# Altium footprint library LION.PcbLib: 90 footprints (part 6 of 13) (continued)
## FCBGA-576P [mil] "FCBGA-576P" (continued)
  lines w15: -472.44,-472.44 -452.76,-452.76 ; -472.44,-275.59 -452.76,-255.91 ; -472.44,-236.22 -452.76,-216.54 ; -472.44,-118.11 -452.76,-98.43 ; -472.44,39.37 -452.76,19.69 ; -472.44,157.48 -452.76,137.8 ; -472.44,275.59 -452.76,255.91 ; -472.44,314.96 -452.76,295.28 ; -472.44,472.44 -452.76,452.76 ; -433.07,-275.59 -413.39,-255.91 ; -433.07,-236.22 -413.39,-216.54 ; -433.07,-118.11 -413.39,-98.43 ; -433.07,39.37 -413.39,19.69 ; -433.07,157.48 -413.39,137.8 ; -433.07,275.59 -413.39,255.91 ; -433.07,314.96 -413.39,295.28 ; -433.07,354.33 -413.39,334.65 ; -393.7,-393.7 -374.02,-374.02 ; -393.7,-354.33 -374.02,-334.65 ; -393.7,-314.96 -374.02,-295.28 ; -393.7,-275.59 -374.02,-255.91 ; -393.7,-236.22 -374.02,-216.54 ; -393.7,-196.85 -374.02,-177.17 ; -393.7,-157.48 -374.02,-137.8 ; -393.7,-118.11 -374.02,-98.43 ; -393.7,-78.74 -374.02,-59.06 ; -393.7,-39.37 -374.02,-19.69 ; -393.7,39.37 -374.02,19.69 ; -393.7,78.74 -374.02,59.06 ; -393.7,118.11 -374.02,98.43 ; -393.7,157.48 -374.02,137.8 ; -393.7,196.85 -374.02,177.17 ; -393.7,236.22 -374.02,216.54 ; -393.7,275.59 -374.02,255.91 ; -393.7,314.96 -374.02,295.28 ; -393.7,354.33 -374.02,334.65 ; -393.7,393.7 -374.02,374.02 ; -393.7,433.07 -374.02,413.39 ; -393.7,472.44 -374.02,452.76 ; -354.33,-393.7 -334.65,-374.02 ; -354.33,-354.33 -334.65,-334.65 ; -354.33,-314.96 -334.65,-295.28 ; -354.33,-275.59 -334.65,-255.91 ; -354.33,-236.22 -334.65,-216.54 ; -354.33,-118.11 -334.65,-98.43 ; -354.33,39.37 -334.65,19.69 ; -354.33,157.48 -334.65,137.8 ; -354.33,275.59 -334.65,255.91 ; -354.33,314.96 -334.65,295.28 ; -354.33,354.33 -334.65,334.65 ; -354.33,393.7 -334.65,374.02 ; -354.33,433.07 -334.65,413.39 ; -354.33,472.44 -334.65,452.76 ; -314.96,-433.07 -295.28,-413.39 ; -314.96,-393.7 -295.28,-374.02 ; -314.96,-354.33 -295.28,-334.65 ; -314.96,-314.96 -295.28,-295.28 ; -314.96,-275.59 -295.28,-255.91 ; -314.96,-236.22 -295.28,-216.54 ; -314.96,-118.11 -295.28,-98.43 ; -314.96,39.37 -295.28,19.69 ; -314.96,157.48 -295.28,137.8 ; -314.96,275.59 -295.28,255.91 ; -314.96,314.96 -295.28,295.28 ; -314.96,354.33 -295.28,334.65 ; -314.96,393.7 -295.28,374.02 ; -314.96,433.07 -295.28,413.39 ; -314.96,472.44 -295.28,452.76 ; -275.59,-472.44 -255.91,-452.76 ; -275.59,-433.07 -255.91,-413.39 ; -275.59,-393.7 -255.91,-374.02 ; -275.59,-354.33 -255.91,-334.65 ; -275.59,-314.96 -255.91,-295.28 ; -275.59,-275.59 -255.91,-255.91 ; -275.59,-236.22 -255.91,-216.54 ; -275.59,-196.85 -255.91,-177.17 ; -275.59,-157.48 -255.91,-137.8 ; -275.59,-118.11 -255.91,-98.43 ; -275.59,-78.74 -255.91,-59.06 ; -275.59,-39.37 -255.91,-19.69 ; -275.59,39.37 -255.91,19.69 ; -275.59,78.74 -255.91,59.06 ; -275.59,118.11 -255.91,98.43 ; -275.59,157.48 -255.91,137.8 ; -275.59,196.85 -255.91,177.17 ; -275.59,236.22 -255.91,216.54 ; -275.59,275.59 -255.91,255.91 ; -275.59,314.96 -255.91,295.28 ; -275.59,354.33 -255.91,334.65 ; -275.59,393.7 -255.91,374.02 ; -275.59,433.07 -255.91,413.39 ; -275.59,472.44 -255.91,452.76 ; -236.22,-393.7 -216.54,-374.02 ; -236.22,-275.59 -216.54,-255.91 ; -236.22,-236.22 -216.54,-216.54 ; -236.22,-196.85 -216.54,-177.17 ; -236.22,-157.48 -216.54,-137.8 ; -236.22,-118.11 -216.54,-98.43 ; -236.22,-78.74 -216.54,-59.06 ; -236.22,-39.37 -216.54,-19.69 ; -236.22,39.37 -216.54,19.69 ; -236.22,78.74 -216.54,59.06 ; -236.22,118.11 -216.54,98.43 ; -236.22,157.48 -216.54,137.8 ; -236.22,196.85 -216.54,177.17 ; -236.22,236.22 -216.54,216.54 ; -236.22,275.59 -216.54,255.91 ; -236.22,314.96 -216.54,295.28 ; -236.22,354.33 -216.54,334.65 ; -236.22,393.7 -216.54,374.02 ; -236.22,433.07 -216.54,413.39 ; -236.22,472.44 -216.54,452.76 ; -196.85,-393.7 -177.17,-374.02 ; -196.85,-275.59 -177.17,-255.91 ; -196.85,-236.22 -177.17,-216.54 ; -196.85,-196.85 -177.17,-177.17 ; -196.85,-157.48 -177.17,-137.8 ; -196.85,-118.11 -177.17,-98.43 ; -196.85,-78.74 -177.17,-59.06 ; -196.85,-39.37 -177.17,-19.69 ; -196.85,39.37 -177.17,19.69 ; -196.85,78.74 -177.17,59.06 ; -196.85,118.11 -177.17,98.43 ; -196.85,157.48 -177.17,137.8 ; -196.85,196.85 -177.17,177.17 ; -196.85,236.22 -177.17,216.54 ; -196.85,275.59 -177.17,255.91 ; -196.85,393.7 -177.17,374.02 ; -157.48,-472.44 -137.8,-452.76 ; -157.48,-433.07 -137.8,-413.39 ; -157.48,-393.7 -137.8,-374.02 ; -157.48,-354.33 -137.8,-334.65 ; -157.48,-314.96 -137.8,-295.28 ; -157.48,-275.59 -137.8,-255.91 ; -157.48,-236.22 -137.8,-216.54 ; -157.48,-196.85 -137.8,-177.17 ; -157.48,-157.48 -137.8,-137.8 ; -157.48,-118.11 -137.8,-98.43 ; -157.48,-78.74 -137.8,-59.06 ; -157.48,-39.37 -137.8,-19.69 ; -157.48,39.37 -137.8,19.69 ; -157.48,78.74 -137.8,59.06 ; -157.48,118.11 -137.8,98.43 ; -157.48,157.48 -137.8,137.8 ; -157.48,196.85 -137.8,177.17 ; -157.48,236.22 -137.8,216.54 ; -157.48,275.59 -137.8,255.91 ; -157.48,393.7 -137.8,374.02 ; -118.11,-393.7 -98.43,-374.02 ; -118.11,-275.59 -98.43,-255.91 ; -118.11,-236.22 -98.43,-216.54 ; -118.11,-196.85 -98.43,-177.17 ; -118.11,-157.48 -98.43,-137.8 ; -118.11,-118.11 -98.43,-98.43 ; -118.11,-78.74 -98.43,-59.06 ; -118.11,-39.37 -98.43,-19.69 ; -118.11,39.37 -98.43,19.69 ; -118.11,78.74 -98.43,59.06 ; -118.11,118.11 -98.43,98.43 ; -118.11,157.48 -98.43,137.8 ; -118.11,196.85 -98.43,177.17 ; -118.11,236.22 -98.43,216.54 ; -118.11,275.59 -98.43,255.91 ; -118.11,314.96 -98.43,295.28 ; -118.11,354.33 -98.43,334.65 ; -118.11,393.7 -98.43,374.02 ; -118.11,433.07 -98.43,413.39 ; -118.11,472.44 -98.43,452.76 ; -78.74,-393.7 -59.06,-374.02 ; -78.74,-275.59 -59.06,-255.91 ; -78.74,-236.22 -59.06,-216.54 ; -78.74,-196.85 -59.06,-177.17 ; -78.74,-157.48 -59.06,-137.8 ; -78.74,-118.11 -59.06,-98.43 ; -78.74,-78.74 -59.06,-59.06 ; -78.74,-39.37 -59.06,-19.69 ; -78.74,39.37 -59.06,19.69 ; -78.74,78.74 -59.06,59.06 ; -78.74,118.11 -59.06,98.43 ; -78.74,157.48 -59.06,137.8 ; -78.74,196.85 -59.06,177.17 ; -78.74,236.22 -59.06,216.54 ; -78.74,275.59 -59.06,255.91 ; -78.74,393.7 -59.06,374.02 ; -39.37,-472.44 -19.69,-452.76 ; -39.37,-433.07 -19.69,-413.39 ; -39.37,-393.7 -19.69,-374.02 ; -39.37,-354.33 -19.69,-334.65 ; -39.37,-314.96 -19.69,-295.28 ; -39.37,-275.59 -19.69,-255.91 ; -39.37,-236.22 -19.69,-216.54 ; -39.37,-196.85 -19.69,-177.17 ; -39.37,-157.48 -19.69,-137.8 ; -39.37,-118.11 -19.69,-98.43 ; -39.37,-78.74 -19.69,-59.06 ; -39.37,-39.37 -19.69,-19.69 ; -39.37,39.37 -19.69,19.69 ; -39.37,78.74 -19.69,59.06 ; -39.37,118.11 -19.69,98.43 ; -39.37,157.48 -19.69,137.8 ; -39.37,196.85 -19.69,177.17 ; -39.37,236.22 -19.69,216.54 ; -39.37,275.59 -19.69,255.91 ; -39.37,393.7 -19.69,374.02 ; 19.69,-374.02 39.37,-393.7 ; 19.69,-255.91 39.37,-275.59 ; 19.69,-216.54 39.37,-236.22 ; 19.69,-177.17 39.37,-196.85 ; 19.69,-137.8 39.37,-157.48 ; 19.69,-98.43 39.37,-118.11 ; 19.69,-59.06 39.37,-78.74 ; 19.69,-19.69 39.37,-39.37 ; 19.69,19.69 39.37,39.37 ; 19.69,59.06 39.37,78.74 ; 19.69,98.43 39.37,118.11 ; 19.69,137.8 39.37,157.48 ; 19.69,177.17 39.37,196.85 ; 19.69,216.54 39.37,236.22 ; 19.69,255.91 39.37,275.59 ; 19.69,295.28 39.37,314.96 ; 19.69,334.65 39.37,354.33 ; 19.69,374.02 39.37,393.7 ; 19.69,413.39 39.37,433.07 ; 19.69,452.76 39.37,472.44 ; 59.06,-374.02 78.74,-393.7 ; 59.06,-255.91 78.74,-275.59 ; 59.06,-216.54 78.74,-236.22 ; 59.06,-177.17 78.74,-196.85 ; 59.06,-137.8 78.74,-157.48 ; 59.06,-98.43 78.74,-118.11 ; 59.06,-59.06 78.74,-78.74 ; 59.06,-19.69 78.74,-39.37 ; 59.06,19.69 78.74,39.37 ; 59.06,59.06 78.74,78.74 ; 59.06,98.43 78.74,118.11 ; 59.06,137.8 78.74,157.48 ; 59.06,177.17 78.74,196.85 ; 59.06,216.54 78.74,236.22 ; 59.06,255.91 78.74,275.59 ; 59.06,374.02 78.74,393.7 ; 98.43,-452.76 118.11,-472.44 ; 98.43,-413.39 118.11,-433.07 ; 98.43,-374.02 118.11,-393.7 ; 98.43,-334.65 118.11,-354.33 ; 98.43,-295.28 118.11,-314.96 ; 98.43,-255.91 118.11,-275.59 ; 98.43,-216.54 118.11,-236.22 ; 98.43,-177.17 118.11,-196.85 ; 98.43,-137.8 118.11,-157.48 ; 98.43,-98.43 118.11,-118.11 ; 98.43,-59.06 118.11,-78.74 ; 98.43,-19.69 118.11,-39.37 ; 98.43,19.69 118.11,39.37 ; 98.43,59.06 118.11,78.74 ; 98.43,98.43 118.11,118.11 ; 98.43,137.8 118.11,157.48 ; 98.43,177.17 118.11,196.85 ; 98.43,216.54 118.11,236.22 ; 98.43,255.91 118.11,275.59 ; 98.43,374.02 118.11,393.7 ; 137.8,-374.02 157.48,-393.7 ; 137.8,-255.91 157.48,-275.59 ; 137.8,-216.54 157.48,-236.22 ; 137.8,-177.17 157.48,-196.85 ; 137.8,-137.8 157.48,-157.48 ; 137.8,-98.43 157.48,-118.11 ; 137.8,-59.06 157.48,-78.74 ; 137.8,-19.69 157.48,-39.37 ; 137.8,19.69 157.48,39.37 ; 137.8,59.06 157.48,78.74 ; 137.8,98.43 157.48,118.11 ; 137.8,137.8 157.48,157.48 ; 137.8,177.17 157.48,196.85 ; 137.8,216.54 157.48,236.22 ; 137.8,255.91 157.48,275.59 ; 137.8,295.28 157.48,314.96 ; 137.8,334.65 157.48,354.33 ; 137.8,374.02 157.48,393.7 ; 137.8,413.39 157.48,433.07 ; 137.8,452.76 157.48,472.44 ; 177.17,-374.02 196.85,-393.7 ; 177.17,-255.91 196.85,-275.59 ; 177.17,-216.54 196.85,-236.22 ; 177.17,-177.17 196.85,-196.85 ; 177.17,-137.8 196.85,-157.48 ; 177.17,-98.43 196.85,-118.11 ; 177.17,-59.06 196.85,-78.74 ; 177.17,-19.69 196.85,-39.37 ; 177.17,19.69 196.85,39.37 ; 177.17,59.06 196.85,78.74 ; 177.17,98.43 196.85,118.11 ; 177.17,137.8 196.85,157.48 ; 177.17,177.17 196.85,196.85 ; 177.17,216.54 196.85,236.22 ; 177.17,255.91 196.85,275.59 ; 177.17,374.02 196.85,393.7 ; 216.54,-452.76 236.22,-472.44 ; 216.54,-413.39 236.22,-433.07 ; 216.54,-374.02 236.22,-393.7 ; 216.54,-334.65 236.22,-354.33 ; 216.54,-295.28 236.22,-314.96 ; 216.54,-255.91 236.22,-275.59 ; 216.54,-216.54 236.22,-236.22 ; 216.54,-177.17 236.22,-196.85 ; 216.54,-137.8 236.22,-157.48 ; 216.54,-98.43 236.22,-118.11 ; 216.54,-59.06 236.22,-78.74 ; 216.54,-19.69 236.22,-39.37 ; 216.54,19.69 236.22,39.37 ; 216.54,59.06 236.22,78.74 ; 216.54,98.43 236.22,118.11 ; 216.54,137.8 236.22,157.48 ; 216.54,177.17 236.22,196.85 ; 216.54,216.54 236.22,236.22 ; 216.54,255.91 236.22,275.59 ; 216.54,374.02 236.22,393.7 ; 255.91,-452.76 275.59,-472.44 ; 255.91,-413.39 275.59,-433.07 ; 255.91,-374.02 275.59,-393.7 ; 255.91,-334.65 275.59,-354.33 ; 255.91,-295.28 275.59,-314.96 ; 255.91,-255.91 275.59,-275.59 ; 255.91,-216.54 275.59,-236.22 ; 255.91,-177.17 275.59,-196.85 ; 255.91,-137.8 275.59,-157.48 ; 255.91,-98.43 275.59,-118.11 ; 255.91,-59.06 275.59,-78.74 ; 255.91,-19.69 275.59,-39.37 ; 255.91,19.69 275.59,39.37 ; 255.91,59.06 275.59,78.74 ; 255.91,98.43 275.59,118.11 ; 255.91,137.8 275.59,157.48 ; 255.91,177.17 275.59,196.85 ; 255.91,216.54 275.59,236.22 ; 255.91,255.91 275.59,275.59 ; 255.91,295.28 275.59,314.96 ; 255.91,334.65 275.59,354.33 ; 255.91,374.02 275.59,393.7 ; 255.91,413.39 275.59,433.07 ; 255.91,452.76 275.59,472.44 ; 295.28,-452.76 314.96,-472.44 ; 295.28,-413.39 314.96,-433.07 ; 295.28,-374.02 314.96,-393.7 ; 295.28,-334.65 314.96,-354.33 ; 295.28,-295.28 314.96,-314.96 ; 295.28,-255.91 314.96,-275.59 ; 295.28,-137.8 314.96,-157.48 ; 295.28,-19.69 314.96,-39.37 ; 295.28,98.43 314.96,118.11 ; 295.28,216.54 314.96,236.22 ; 295.28,255.91 314.96,275.59 ; 295.28,295.28 314.96,314.96 ; 295.28,334.65 314.96,354.33 ; 295.28,374.02 314.96,393.7 ; 334.65,-452.76 354.33,-472.44 ; 334.65,-413.39 354.33,-433.07 ; 334.65,-295.28 354.33,-314.96 ; 334.65,-255.91 354.33,-275.59 ; 334.65,-137.8 354.33,-157.48 ; 334.65,-19.69 354.33,-39.37 ; 334.65,98.43 354.33,118.11 ; 334.65,216.54 354.33,236.22 ; 334.65,255.91 354.33,275.59 ; 334.65,295.28 354.33,314.96 ; 334.65,334.65 354.33,354.33 ; 334.65,374.02 354.33,393.7 ; 374.02,-413.39 393.7,-433.07 ; 374.02,-295.28 393.7,-314.96 ; 374.02,-255.91 393.7,-275.59 ; 374.02,-216.54 393.7,-236.22 ; 374.02,-177.17 393.7,-196.85 ; 374.02,-137.8 393.7,-157.48 ; 374.02,-98.43 393.7,-118.11 ; 374.02,-59.06 393.7,-78.74 ; 374.02,-19.69 393.7,-39.37 ; 374.02,19.69 393.7,39.37 ; 374.02,59.06 393.7,78.74 ; 374.02,98.43 393.7,118.11 ; 374.02,137.8 393.7,157.48 ; 374.02,177.17 393.7,196.85 ; 374.02,216.54 393.7,236.22 ; 374.02,255.91 393.7,275.59 ; 374.02,295.28 393.7,314.96 ; 374.02,334.65 393.7,354.33 ; 374.02,374.02 393.7,393.7 ; 413.39,-413.39 433.07,-433.07 ; 413.39,-374.02 433.07,-393.7 ; 413.39,-334.65 433.07,-354.33 ; 413.39,-295.28 433.07,-314.96 ; 413.39,-255.91 433.07,-275.59 ; 413.39,-137.8 433.07,-157.48 ; 413.39,-19.69 433.07,-39.37 ; 413.39,98.43 433.07,118.11 ; 413.39,216.54 433.07,236.22 ; 413.39,255.91 433.07,275.59 ; 413.39,295.28 433.07,314.96 ; 452.76,-452.76 472.44,-472.44 ; 452.76,-374.02 472.44,-393.7 ; 452.76,-255.91 472.44,-275.59 ; 452.76,-137.8 472.44,-157.48 ; 452.76,-19.69 472.44,-39.37 ; 452.76,98.43 472.44,118.11 ; 452.76,216.54 472.44,236.22 ; 452.76,255.91 472.44,275.59 ; 452.76,452.76 472.44,472.44
Bottom Layer:
  lines w15: -635.92,-427.69 -621.51,-413.28 -590.72,-413.28
Top Overlay:
  pour cut-out: -492.13,450.39 -492.13,451.18 -451.18,492.13 -492.13,492.13 -492.52,491.73 -492.52,450.39
  lines w1: -492.13,-492.13 492.13,-492.13 492.13,492.13 -492.13,492.13 -492.13,-492.13
Mechanical 5:
  lines w1: -492.13,-492.13 492.13,-492.13 492.13,492.13 -492.13,492.13 -492.13,-492.13
  text "U61" at -13.43,509.81 h25
Mechanical 14:
  text "H5" at -311.28,177.17 h20
  text "H4" at -350.65,177.17 h20
  text "G2" at -429.39,216.54 h20
  text "K1" at -468.76,98.43 h20
  text "K2" at -429.39,98.43 h20
  text "G1" at -468.76,216.54 h20
  text "L1" at -468.76,59.06 h20
  text "L2" at -429.39,59.06 h20
  text "H1" at -468.76,177.17 h20
  text "H2" at -429.39,177.17 h20
  text "AD5" at -319.28,-452.76 h20
  text "AB22" at 342.02,-374.02 h20
  text "AA22" at 342.02,-334.65 h20
  text "AC4" at -358.65,-413.39 h20
  text "D24" at 428.76,334.65 h20
  text "B24" at 428.76,413.39 h20
  text "C23" at 389.39,374.02 h20
  text "C1" at -468.76,374.02 h20
  text "AD4" at -358.65,-452.76 h20
  text "D23" at 389.39,334.65 h20
  text "Y8" at -193.17,-295.28 h20
  text "AA11" at -91.06,-334.65 h20
  text "AA7" at -240.54,-334.65 h20
  text "AA10" at -130.43,-334.65 h20
  text "Y11" at -83.06,-295.28 h20
  text "AA8" at -201.17,-334.65 h20
  text "Y10" at -122.43,-295.28 h20
  text "Y7" at -232.54,-295.28 h20
  text "U23" at 389.39,-177.17 h20
  text "U24" at 428.76,-177.17 h20
  text "R23" at 389.39,-98.43 h20
  text "R24" at 428.76,-98.43 h20
  text "P24" at 428.76,-59.06 h20
  text "P23" at 389.39,-59.06 h20
  text "V24" at 428.76,-216.54 h20
  text "V23" at 389.39,-216.54 h20
  text "A8" at -193.17,452.76 h20
  text "B8" at -193.17,413.39 h20
  text "A9" at -153.8,452.76 h20
  text "B9" at -153.8,413.39 h20
  text "A11" at -83.06,452.76 h20
  text "B11" at -83.06,413.39 h20
  text "A12" at -43.69,452.76 h20
  text "B12" at -43.69,413.39 h20
  text "H24" at 428.76,177.17 h20
  text "H23" at 389.39,177.17 h20
  text "J24" at 428.76,137.8 h20
  text "J23" at 389.39,137.8 h20
  text "L24" at 428.76,59.06 h20
  text "L23" at 389.39,59.06 h20
  text "M24" at 428.76,19.69 h20
  text "M23" at 389.39,19.69 h20
  text "A14" at 35.06,452.76 h20
  text "B14" at 35.06,413.39 h20
  text "A15" at 74.43,452.76 h20
  text "B15" at 74.43,413.39 h20
  text "A17" at 153.17,452.76 h20
  text "B17" at 153.17,413.39 h20
  text "A18" at 192.54,452.76 h20
  text "B18" at 192.54,413.39 h20
  text "Y13" at -4.31,-295.28 h20
  text "L5" at -311.28,59.06 h20
  text "E14" at 35.06,295.28 h20
  text "P4" at -350.65,-59.06 h20
  text "U5" at -311.28,-177.17 h20
  text "E12" at -43.69,295.28 h20
  text "L20" at 271.28,59.06 h20
  text "M21" at 310.65,19.69 h20
  text "D11" at -83.06,334.65 h20
  text "G4" at -350.65,216.54 h20
  text "AA13" at -12.31,-334.65 h20
  text "M20" at 271.28,19.69 h20
  text "R20" at 271.28,-98.43 h20
  text "H21" at 310.65,177.17 h20
  text "D9" at -153.8,334.65 h20
  text "P5" at -311.28,-59.06 h20
  text "P21" at 310.65,-59.06 h20
  text "D18" at 192.54,334.65 h20
  text "AB21" at 302.65,-374.02 h20
  text "D12" at -43.69,334.65 h20
  text "J21" at 310.65,137.8 h20
  text "AA1" at -476.76,-334.65 h20
  text "Y16" at 113.8,-295.28 h20
  text "D8" at -193.17,334.65 h20
  text "K5" at -311.28,98.43 h20
  text "N5" at -311.28,-19.69 h20
  text "L21" at 310.65,59.06 h20
  text "AA14" at 27.06,-334.65 h20
  text "AA21" at 302.65,-334.65 h20
  text "B20" at 271.28,413.39 h20
  text "E17" at 153.17,295.28 h20
  text "Y14" at 35.06,-295.28 h20
  text "Y17" at 153.17,-295.28 h20
  text "E9" at -153.8,295.28 h20
  text "E11" at -83.06,295.28 h20
  text "T5" at -311.28,-137.8 h20
  text "Y24" at 428.76,-295.28 h20
  text "B2" at -429.39,413.39 h20
  text "P20" at 271.28,-59.06 h20
  text "U20" at 271.28,-177.17 h20
  text "AA2" at -437.39,-334.65 h20
  text "AB2" at -437.39,-374.02 h20
  text "E15" at 74.43,295.28 h20
  text "C24" at 428.76,374.02 h20
  text "AC2" at -437.39,-413.39 h20
  text "K4" at -350.65,98.43 h20
  text "T4" at -350.65,-137.8 h20
  text "N4" at -350.65,-19.69 h20
  text "AB1" at -476.76,-374.02 h20
  text "AD2" at -437.39,-452.76 h20
  text "D15" at 74.43,334.65 h20
  text "AD3" at -398.02,-452.76 h20
  text "U4" at -350.65,-177.17 h20
  text "V21" at 310.65,-216.54 h20
  text "H20" at 271.28,177.17 h20
  text "L4" at -350.65,59.06 h20
  text "A21" at 310.65,452.76 h20
  text "R21" at 310.65,-98.43 h20
  text "AA24" at 420.76,-334.65 h20
  text "AC1" at -476.76,-413.39 h20
  text "AC3" at -398.02,-413.39 h20
  text "E8" at -193.17,295.28 h20
  text "G5" at -311.28,216.54 h20
  text "AA16" at 105.8,-334.65 h20
  text "B1" at -468.76,413.39 h20
  text "J20" at 271.28,137.8 h20
  text "D14" at 35.06,334.65 h20
  text "E18" at 192.54,295.28 h20
  text "A2" at -429.39,452.76 h20
  text "D1" at -468.76,334.65 h20
  text "AA17" at 145.17,-334.65 h20
  text "C2" at -429.39,374.02 h20
  text "V20" at 271.28,-216.54 h20
  text "U21" at 310.65,-177.17 h20
  text "D17" at 153.17,334.65 h20
  text "AC6" at -279.91,-413.39 h20
  text "AD6" at -279.91,-452.76 h20
  text "AD9" at -161.8,-452.76 h20
  text "AC9" at -161.8,-413.39 h20
  text "AC12" at -51.69,-413.39 h20
  text "AD12" at -51.69,-452.76 h20
  text "AC15" at 66.43,-413.39 h20
  text "AD15" at 66.43,-452.76 h20
  text "AD18" at 184.54,-452.76 h20
  text "AC18" at 184.54,-413.39 h20
  text "V2" at -429.39,-216.54 h20
  text "R2" at -429.39,-98.43 h20
  text "R1" at -468.76,-98.43 h20
  text "V1" at -468.76,-216.54 h20
  text "W23" at 389.39,-255.91 h20
  text "W24" at 428.76,-255.91 h20
  text "T23" at 389.39,-137.8 h20
  text "T24" at 428.76,-137.8 h20
  text "J2" at -429.39,137.8 h20
  text "J1" at -468.76,137.8 h20
  text "M1" at -468.76,19.69 h20
  text "M2" at -429.39,19.69 h20
  text "G24" at 428.76,216.54 h20
  text "G23" at 389.39,216.54 h20
  text "K23" at 389.39,98.43 h20
  text "K24" at 428.76,98.43 h20
  text "F1" at -468.76,255.91 h20
  text "F2" at -429.39,255.91 h20
  text "A10" at -122.43,452.76 h20
  text "B10" at -122.43,413.39 h20
  text "A13" at -4.31,452.76 h20
  text "B13" at -4.31,413.39 h20
  text "B7" at -232.54,413.39 h20
  text "A7" at -232.54,452.76 h20
  text "A16" at 113.8,452.76 h20
  text "A19" at 231.91,452.76 h20
  text "B19" at 231.91,413.39 h20
  text "B16" at 113.8,413.39 h20
  text "N23" at 389.39,-19.69 h20
  text "N24" at 428.76,-19.69 h20
  text "W4" at -350.65,-255.91 h20
  text "W5" at -311.28,-255.91 h20
  text "Y9" at -153.8,-295.28 h20
  text "AA9" at -161.8,-334.65 h20
  text "W9" at -153.8,-255.91 h20
  text "AA15" at 66.43,-334.65 h20
  text "Y15" at 74.43,-295.28 h20
  text "W15" at 74.43,-255.91 h20
  text "T19" at 231.91,-137.8 h20
  text "Y19" at 231.91,-295.28 h20
  text "R5" at -311.28,-98.43 h20
  text "R4" at -350.65,-98.43 h20
  text "R6" at -271.91,-98.43 h20
  text "AA19" at 223.91,-334.65 h20
  text "AB23" at 381.39,-374.02 h20
  text "AA23" at 381.39,-334.65 h20
  text "E5" at -311.28,295.28 h20
  text "E6" at -271.91,295.28 h20
  text "F16" at 113.8,255.91 h20
  text "F10" at -122.43,255.91 h20
  text "E16" at 113.8,295.28 h20
  text "D16" at 113.8,334.65 h20
  text "E10" at -122.43,295.28 h20
  text "D10" at -122.43,334.65 h20
  text "J4" at -350.65,137.8 h20
  text "J5" at -311.28,137.8 h20
  text "J6" at -271.91,137.8 h20
  text "T20" at 271.28,-137.8 h20
  text "T21" at 310.65,-137.8 h20
  text "K19" at 231.91,98.43 h20
  text "K20" at 271.28,98.43 h20
  text "K21" at 310.65,98.43 h20
  text "F21" at 310.65,255.91 h20
  text "F20" at 271.28,255.91 h20
  text "W6" at -271.91,-255.91 h20
  text "Y6" at -271.91,-295.28 h20
  text "AA6" at -279.91,-334.65 h20
  text "V4" at -350.65,-216.54 h20
  text "V5" at -311.28,-216.54 h20
  text "Y18" at 192.54,-295.28 h20
  text "AA18" at 184.54,-334.65 h20
  text "Y22" at 350.02,-295.28 h20
  text "W20" at 271.28,-255.91 h20
  text "W21" at 310.65,-255.91 h20
  text "W19" at 231.91,-255.91 h20
  text "W12" at -43.69,-255.91 h20
  text "AA12" at -51.69,-334.65 h20
  text "Y12" at -43.69,-295.28 h20
  text "D7" at -232.54,334.65 h20
  text "E7" at -232.54,295.28 h20
  text "F6" at -271.91,255.91 h20
  text "F4" at -350.65,255.91 h20
  text "F5" at -311.28,255.91 h20
  text "E3" at -390.02,295.28 h20
  text "M6" at -271.91,19.69 h20
  text "M5" at -311.28,19.69 h20
  text "M4" at -350.65,19.69 h20
  text "E19" at 231.91,295.28 h20
  text "F19" at 231.91,255.91 h20
  text "D19" at 231.91,334.65 h20
  text "D13" at -4.31,334.65 h20
  text "E13" at -4.31,295.28 h20
  text "F13" at -4.31,255.91 h20
  text "N19" at 231.91,-19.69 h20
  text "N20" at 271.28,-19.69 h20
  text "N21" at 310.65,-19.69 h20
  text "G20" at 271.28,216.54 h20
  text "G21" at 310.65,216.54 h20
  text "V10" at -122.43,-216.54 h20
  text "V11" at -83.06,-216.54 h20
  text "T8" at -193.17,-137.8 h20
  text "T9" at -153.8,-137.8 h20
  text "U9" at -153.8,-177.17 h20
  text "V7" at -232.54,-216.54 h20
  text "U8" at -193.17,-177.17 h20
  text "P11" at -83.06,-59.06 h20
  text "R11" at -83.06,-98.43 h20
  text "P10" at -122.43,-59.06 h20
  text "R10" at -122.43,-98.43 h20
  text "L7" at -232.54,59.06 h20
  text "P7" at -232.54,-59.06 h20
  text "L10" at -122.43,59.06 h20
  text "K10" at -122.43,98.43 h20
  text "M9" at -153.8,19.69 h20
  text "M8" at -193.17,19.69 h20
  text "K11" at -83.06,98.43 h20
  text "L11" at -83.06,59.06 h20
  text "N8" at -193.17,-19.69 h20
  text "N9" at -153.8,-19.69 h20
  text "K7" at -232.54,98.43 h20
  text "J8" at -193.17,137.8 h20
  text "J9" at -153.8,137.8 h20
  text "J12" at -43.69,137.8 h20
  text "G11" at -83.06,216.54 h20
  text "H12" at -43.69,177.17 h20
  text "H8" at -193.17,177.17 h20
  text "G7" at -232.54,216.54 h20
  text "H9" at -153.8,177.17 h20
  text "V14" at 35.06,-216.54 h20
  text "U13" at -4.31,-177.17 h20
  text "T13" at -4.31,-137.8 h20
  text "T12" at -43.69,-137.8 h20
  text "U12" at -43.69,-177.17 h20
  text "P14" at 35.06,-59.06 h20
  text "R14" at 35.06,-98.43 h20
  text "V18" at 192.54,-216.54 h20
  text "T16" at 113.8,-137.8 h20
  text "T17" at 153.17,-137.8 h20
  text "U16" at 113.8,-177.17 h20
  text "U17" at 153.17,-177.17 h20
  text "R18" at 192.54,-98.43 h20
  text "P15" at 74.43,-59.06 h20
  text "R15" at 74.43,-98.43 h20
  text "L14" at 35.06,59.06 h20
  text "K14" at 35.06,98.43 h20
  text "M13" at -4.31,19.69 h20
  text "M12" at -43.69,19.69 h20
  text "N13" at -4.31,-19.69 h20
  text "N12" at -43.69,-19.69 h20
  text "J13" at -4.31,137.8 h20
  text "G14" at 35.06,216.54 h20
  text "H13" at -4.31,177.17 h20
  text "P18" at 192.54,-59.06 h20
  text "M16" at 113.8,19.69 h20
  text "M17" at 153.17,19.69 h20
  text "L18" at 192.54,59.06 h20
  text "K15" at 74.43,98.43 h20
  text "L15" at 74.43,59.06 h20
  text "N17" at 153.17,-19.69 h20
  text "N16" at 113.8,-19.69 h20
  text "J16" at 113.8,137.8 h20
  text "J17" at 153.17,137.8 h20
  text "H16" at 113.8,177.17 h20
  text "H17" at 153.17,177.17 h20
  text "G18" at 192.54,216.54 h20
  text "G15" at 74.43,216.54 h20
  text "AC14" at 27.06,-413.39 h20
  text "AD13" at -12.31,-452.76 h20
  text "AC17" at 145.17,-413.39 h20
  text "AD16" at 105.8,-452.76 h20
  text "AC13" at -12.31,-413.39 h20
  text "AD17" at 145.17,-452.76 h20
  text "AC16" at 105.8,-413.39 h20
  text "AD14" at 27.06,-452.76 h20
  text "AD10" at -130.43,-452.76 h20
  text "AC10" at -130.43,-413.39 h20
  text "AC7" at -240.54,-413.39 h20
  text "AD11" at -91.06,-452.76 h20
  text "AC11" at -91.06,-413.39 h20
  text "AC8" at -201.17,-413.39 h20
  text "AD8" at -201.17,-452.76 h20
  text "AD7" at -240.54,-452.76 h20
  text "AC24" at 420.76,-413.39 h20
  text "A20" at 271.28,452.76 h20
  text "A22" at 350.02,452.76 h20
  text "AD23" at 381.39,-452.76 h20
  text "A23" at 389.39,452.76 h20
  text "AD22" at 342.02,-452.76 h20
  text "B23" at 389.39,413.39 h20
  text "Y1" at -468.76,-295.28 h20
  text "Y2" at -429.39,-295.28 h20
  text "B22" at 350.02,413.39 h20
  text "B21" at 310.65,413.39 h20
  text "E24" at 428.76,295.28 h20
  text "U1" at -468.76,-177.17 h20
  text "T2" at -429.39,-137.8 h20
  text "P1" at -468.76,-59.06 h20
  text "U2" at -429.39,-177.17 h20
  text "N1" at -468.76,-19.69 h20
  text "T1" at -468.76,-137.8 h20
  text "P2" at -429.39,-59.06 h20
  text "N2" at -429.39,-19.69 h20
  text "AB3" at -398.02,-374.02 h20
  text "AB4" at -358.65,-374.02 h20
  text "AC5" at -319.28,-413.39 h20
  text "AA3" at -398.02,-334.65 h20
  text "AB20" at 263.28,-374.02 h20
  text "AD19" at 223.91,-452.76 h20
  text "AC20" at 263.28,-413.39 h20
  text "AD20" at 263.28,-452.76 h20
  text "AC19" at 223.91,-413.39 h20
  text "AD21" at 302.65,-452.76 h20
  text "Y20" at 271.28,-295.28 h20
  text "E2" at -429.39,295.28 h20
  text "D4" at -350.65,334.65 h20
  text "D3" at -390.02,334.65 h20
  text "E23" at 389.39,295.28 h20
  text "D22" at 350.02,334.65 h20
  text "C21" at 310.65,374.02 h20
  text "C22" at 350.02,374.02 h20
  text "AD1" at -476.76,-452.76 h20
  text "AC22" at 342.02,-413.39 h20
  text "AC23" at 381.39,-413.39 h20
  text "AC21" at 302.65,-413.39 h20
  text "AD24" at 420.76,-452.76 h20
  text "V3" at -390.02,-216.54 h20
  text "W3" at -390.02,-255.91 h20
  text "V6" at -271.91,-216.54 h20
  text "T6" at -271.91,-137.8 h20
  text "Y3" at -390.02,-295.28 h20
  text "Y4" at -350.65,-295.28 h20
  text "Y5" at -311.28,-295.28 h20
  text "U3" at -390.02,-177.17 h20
  text "U6" at -271.91,-177.17 h20
  text "AA4" at -358.65,-334.65 h20
  text "AA5" at -319.28,-334.65 h20
  text "AB5" at -319.28,-374.02 h20
  text "AB6" at -279.91,-374.02 h20
  text "W2" at -429.39,-255.91 h20
  text "W1" at -468.76,-255.91 h20
  text "R3" at -390.02,-98.43 h20
  text "T3" at -390.02,-137.8 h20
  text "W7" at -232.54,-255.91 h20
  text "W8" at -193.17,-255.91 h20
  text "W10" at -122.43,-255.91 h20
  text "W11" at -83.06,-255.91 h20
  text "W13" at -4.31,-255.91 h20
  text "W14" at 35.06,-255.91 h20
  text "V12" at -43.69,-216.54 h20
  text "U10" at -122.43,-177.17 h20
  text "V9" at -153.8,-216.54 h20
  text "R7" at -232.54,-98.43 h20
  text "AB14" at 27.06,-374.02 h20
  text "AB13" at -12.31,-374.02 h20
  text "AB12" at -51.69,-374.02 h20
  text "AB11" at -91.06,-374.02 h20
  text "AB10" at -130.43,-374.02 h20
  text "AB9" at -161.8,-374.02 h20
  text "AB8" at -201.17,-374.02 h20
  text "AB7" at -240.54,-374.02 h20
  text "U14" at 35.06,-177.17 h20
  text "T14" at 35.06,-137.8 h20
  text "V13" at -4.31,-216.54 h20
  text "V8" at -193.17,-216.54 h20
  text "U11" at -83.06,-177.17 h20
  text "T11" at -83.06,-137.8 h20
  text "T10" at -122.43,-137.8 h20
  text "T7" at -232.54,-137.8 h20
  text "R13" at -4.31,-98.43 h20
  text "P13" at -4.31,-59.06 h20
  text "R12" at -43.69,-98.43 h20
  text "P12" at -43.69,-59.06 h20
  text "R9" at -153.8,-98.43 h20
  text "P9" at -153.8,-59.06 h20
  text "U7" at -232.54,-177.17 h20
  text "R8" at -193.17,-98.43 h20
  text "AB17" at 145.17,-374.02 h20
  text "W16" at 113.8,-255.91 h20
  text "W17" at 153.17,-255.91 h20
  text "W18" at 192.54,-255.91 h20
  text "V19" at 231.91,-216.54 h20
  text "V16" at 113.8,-216.54 h20
  text "V15" at 74.43,-216.54 h20
  text "T18" at 192.54,-137.8 h20
  text "T22" at 350.02,-137.8 h20
  text "U22" at 350.02,-177.17 h20
  text "V22" at 350.02,-216.54 h20
  text "U19" at 231.91,-177.17 h20
  text "R19" at 231.91,-98.43 h20
  text "R22" at 350.02,-98.43 h20
  text "AA20" at 263.28,-334.65 h20
  text "W22" at 350.02,-255.91 h20
  text "Y21" at 310.65,-295.28 h20
  text "AB16" at 105.8,-374.02 h20
  text "AB15" at 66.43,-374.02 h20
  text "AB18" at 184.54,-374.02 h20
  text "AB19" at 223.91,-374.02 h20
  text "V17" at 153.17,-216.54 h20
  text "U15" at 74.43,-177.17 h20
  text "T15" at 74.43,-137.8 h20
  text "R17" at 153.17,-98.43 h20
  text "P17" at 153.17,-59.06 h20
  text "R16" at 113.8,-98.43 h20
  text "P16" at 113.8,-59.06 h20
  text "U18" at 192.54,-177.17 h20
  text "AB24" at 420.76,-374.02 h20
  text "Y23" at 389.39,-295.28 h20
  text "N6" at -271.91,-19.69 h20
  text "P6" at -271.91,-59.06 h20
  text "M3" at -390.02,19.69 h20
  text "N3" at -390.02,-19.69 h20
  text "H6" at -271.91,177.17 h20
  text "G6" at -271.91,216.54 h20
  text "P3" at -390.02,-59.06 h20
  text "L3" at -390.02,59.06 h20
  text "K6" at -271.91,98.43 h20
  text "L6" at -271.91,59.06 h20
  text "K3" at -390.02,98.43 h20
  text "H3" at -390.02,177.17 h20
  text "J3" at -390.02,137.8 h20
  text "G3" at -390.02,216.54 h20
  text "M7" at -232.54,19.69 h20
  text "J7" at -232.54,137.8 h20
  text "G13" at -4.31,216.54 h20
  text "G9" at -153.8,216.54 h20
  text "G10" at -122.43,216.54 h20
  text "P8" at -193.17,-59.06 h20
  text "M14" at 35.06,19.69 h20
  text "M15" at 74.43,19.69 h20
  text "M11" at -83.06,19.69 h20
  text "L9" at -153.8,59.06 h20
  text "M10" at -122.43,19.69 h20
  text "G8" at -193.17,216.54 h20
  text "L12" at -43.69,59.06 h20
  text "K12" at -43.69,98.43 h20
  text "L13" at -4.31,59.06 h20
  text "K13" at -4.31,98.43 h20
  text "K8" at -193.17,98.43 h20
  text "K9" at -153.8,98.43 h20
  text "N14" at 35.06,-19.69 h20
  text "N11" at -83.06,-19.69 h20
  text "N10" at -122.43,-19.69 h20
  text "N7" at -232.54,-19.69 h20
  text "L8" at -193.17,59.06 h20
  text "J14" at 35.06,137.8 h20
  text "J11" at -83.06,137.8 h20
  text "J10" at -122.43,137.8 h20
  text "H14" at 35.06,177.17 h20
  text "H10" at -122.43,177.17 h20
  text "H11" at -83.06,177.17 h20
  text "H7" at -232.54,177.17 h20
  text "G12" at -43.69,216.54 h20
  text "P19" at 231.91,-59.06 h20
  text "M22" at 350.02,19.69 h20
  text "M19" at 231.91,19.69 h20
  text "L22" at 350.02,59.06 h20
  text "N18" at 192.54,-19.69 h20
  text "L19" at 231.91,59.06 h20
  text "K18" at 192.54,98.43 h20
  text "K22" at 350.02,98.43 h20
  text "J22" at 350.02,137.8 h20
  text "J19" at 231.91,137.8 h20
  text "H19" at 231.91,177.17 h20
  text "H22" at 350.02,177.17 h20
  text "G19" at 231.91,216.54 h20
  text "G22" at 350.02,216.54 h20
  text "G16" at 113.8,216.54 h20
  text "L17" at 153.17,59.06 h20
  text "M18" at 192.54,19.69 h20
  text "K16" at 113.8,98.43 h20
  text "K17" at 153.17,98.43 h20
  text "N15" at 74.43,-19.69 h20
  text "L16" at 113.8,59.06 h20
  text "J18" at 192.54,137.8 h20
  text "H15" at 74.43,177.17 h20
  text "J15" at 74.43,137.8 h20
  text "H18" at 192.54,177.17 h20
  text "G17" at 153.17,216.54 h20
  text "N22" at 350.02,-19.69 h20
  text "P22" at 350.02,-59.06 h20
  text "F3" at -390.02,255.91 h20
  text "C5" at -311.28,374.02 h20
  text "D5" at -311.28,334.65 h20
  text "D6" at -271.91,334.65 h20
  text "B6" at -271.91,413.39 h20
  text "C7" at -232.54,374.02 h20
  text "C6" at -271.91,374.02 h20
  text "A6" at -271.91,452.76 h20
  text "A5" at -311.28,452.76 h20
  text "A4" at -350.65,452.76 h20
  text "A3" at -390.02,452.76 h20
  text "A1" at -468.76,452.76 h20
  text "E1" at -468.76,295.28 h20
  text "B5" at -311.28,413.39 h20
  text "B4" at -350.65,413.39 h20
  text "B3" at -390.02,413.39 h20
  text "C3" at -390.02,374.02 h20
  text "C4" at -350.65,374.02 h20
  text "D2" at -429.39,334.65 h20
  text "E4" at -350.65,295.28 h20
  text "F7" at -232.54,255.91 h20
  text "F8" at -193.17,255.91 h20
  text "F9" at -153.8,255.91 h20
  text "F11" at -83.06,255.91 h20
  text "F12" at -43.69,255.91 h20
  text "F14" at 35.06,255.91 h20
  text "C8" at -193.17,374.02 h20
  text "C9" at -153.8,374.02 h20
  text "C10" at -122.43,374.02 h20
  text "C11" at -83.06,374.02 h20
  text "C12" at -43.69,374.02 h20
  text "C13" at -4.31,374.02 h20
  text "C14" at 35.06,374.02 h20
  text "F15" at 74.43,255.91 h20
  text "F17" at 153.17,255.91 h20
  text "E21" at 310.65,295.28 h20
  text "E20" at 271.28,295.28 h20
  text "F18" at 192.54,255.91 h20
  text "F22" at 350.02,255.91 h20
  text "D20" at 271.28,334.65 h20
  text "C15" at 74.43,374.02 h20
  text "C17" at 153.17,374.02 h20
  text "C16" at 113.8,374.02 h20
  text "C19" at 231.91,374.02 h20
  text "C18" at 192.54,374.02 h20
  text "E22" at 350.02,295.28 h20
  text "D21" at 310.65,334.65 h20
  text "C20" at 271.28,374.02 h20
  text "F23" at 389.39,255.91 h20
  text "F24" at 428.76,255.91 h20
  text "A24" at 428.76,452.76 h20
Mechanical 16:
  lines w1: -492.13,-492.13 492.13,-492.13 ; -492.13,-492.13 -492.13,492.13 ; -492.13,-492.13 492.13,-492.13 ; -492.13,-492.13 -492.13,492.13 ; -492.13,-492.13 492.13,-492.13 ; -492.13,-492.13 -492.13,492.13 ; -492.13,492.13 492.13,492.13 ; -492.13,492.13 492.13,492.13 ; -492.13,492.13 492.13,492.13 ; 492.13,-492.13 492.13,492.13 ; 492.13,-492.13 492.13,492.13 ; 492.13,-492.13 492.13,492.13
Mechanical 17:
  text ".Designator" at -30,-8.34 h25